# Altium footprint library image.PcbLib: 9 footprints
Each footprint in its own frame and in the unit in brackets; x right, y up, seen from the top. Pads: shape width x height; smd on the part's side, far side on the other; paste and mask are expansions set on the pad; w line width, h text height; cw(c..) or ccw(c..) is an arc to the next point about the centre after c.
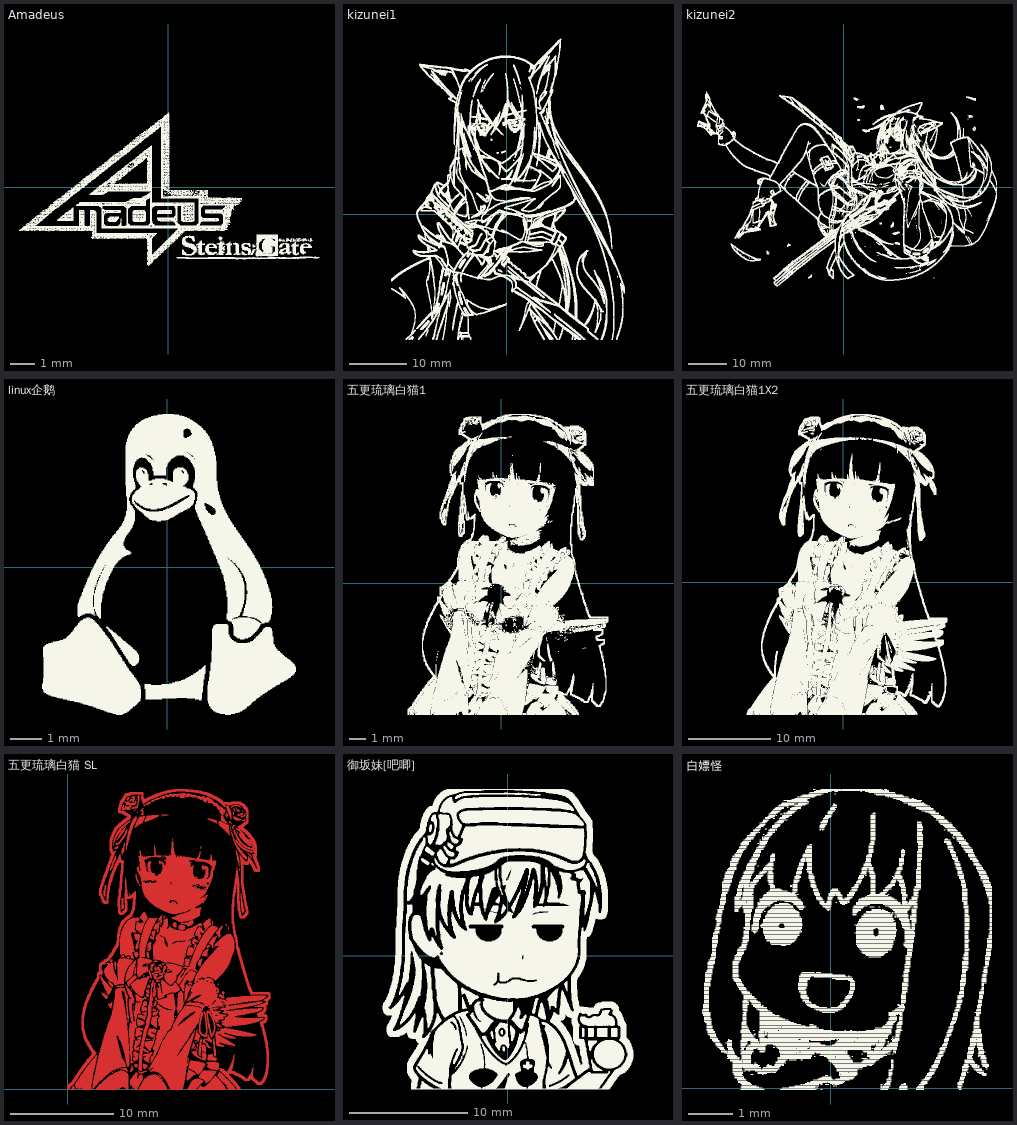
[diagram p0: the footprints below, top view; thin cyan lines are the x and y axes]

## Amadeus [mm]
Top Overlay:
  drawing of 5010 lines, arcs and shapes, not listed

## kizunei1 [mm]
Top Overlay:
  drawing of 54572 lines, arcs and shapes, not listed

## kizunei2 [mm]
Top Overlay:
  drawing of 84010 lines, arcs and shapes, not listed

## linux企鹅 [mm]
Top Overlay:
  drawing of 1193 lines, arcs and shapes, not listed

## 五更琉璃白猫1 [mm]
Top Overlay:
  drawing of 11189 lines, arcs and shapes, not listed

## 五更琉璃白猫1X2 [mm]
Top Overlay:
  drawing of 21630 lines, arcs and shapes, not listed

## 五更琉璃白猫 SL [mm]
Top Layer:
  drawing of 14833 lines, arcs and shapes, not listed
Top Solder:
  drawing of 14833 lines, arcs and shapes, not listed

## 御坂妹[吧唧] [mm]
Top Overlay:
  drawing of 11207 lines, arcs and shapes, not listed

## 白嫖怪 [mm]
Top Overlay:
  drawing of 2170 lines, arcs and shapes, not listed